# Altium integrated library MCU_CPU.IntLib: 57 symbols (part 1 of 2) (continued)
## 1892ВМ14Я (continued)
part O pins: AC12 GND, AC13 GND, AC16 GND, AC17 GND, AC20 GND, AC21 GND, AC24 GND, AC25 GND, AC29 GND, AC30 GND, AC31 GND, AD12 GND, AD13 GND, AD16 GND, AD17 GND, AD20 GND, AD21 GND, AD24 GND, AD25 GND, AD29 GND, AD30 GND, AD31 GND, AE10 GND, AE11 GND, AE14 GND, AE15 GND, AE18 GND, AE19 GND, AE22 GND, AE23 GND, AE26 GND, AE27 GND, AE28 GND, AE29 GND, AE30 GND, AE31 GND, AF10 GND, AF11 GND, AF14 GND, AF15 GND, AF18 GND, AF19 GND, AF22 GND, AF23 GND, AF26 GND, AF27 GND, AF28 GND, AF29 GND, AF30 GND, AF31 GND, AG14 GND, AG15 GND, AG16 GND, AG17 GND, AG26 GND, AG27 GND, AG28 GND, AG29 GND, AG30 GND, AG31 GND, AH16 GND, AH17 GND, AH26 GND, AH27 GND, AH28 GND, AH29 GND, AH30 GND, AH31 GND, AJ15 GND, AJ16 GND, AJ17 GND, AJ18 GND, AJ19 GND, AJ20 GND, AJ21 GND, AJ22 GND, AJ23 GND, AJ24 GND, AJ25 GND, AJ26 GND, AJ27 GND, AJ28 GND, AJ29 GND, AJ30 GND, AJ31 GND, AK17 GND, AK18 GND, AK19 GND, AK20 GND, AK21 GND
part P pins: AF6 RSVD10, AF7 RSVD8, AG6 RSVD15, AG7 RSVD14, AG10 RSVD0, AH6 RSVD17, AH7 RSVD16, AH8 RSVD7, AH9 RSVD4, AH10 RSVD3, AJ6 RSVD11, AJ7 RSVD12, AJ8 RSVD6, AJ9 RSVD2, AK6 RSVD13, AK7 RSVD9, AK8 RSVD5, AK9 RSVD1, AK22 GND, AK23 GND, AK24 GND, AK25 GND, AK26 GND, AK27 GND, AK28 GND, AK29 GND, AK30 GND, AK31 GND, AL17 GND, AL18 GND, AL19 GND, AL20 GND, AL21 GND, AL22 GND, AL23 GND, AL24 GND, AL25 GND, AL26 GND, AL27 GND, AL28 GND, AL29 GND, AL30 GND, AL31 GND, AP4 GND
part A text: CPU
part B text: CPU
part C text: CPU
part D text: CPU
part E text: CPU
part F text: CPU
part G text: CPU
part H text: CPU
part I text: CPU
part J text: CPU
part K text: CPU
part L text: CPU
part M text: CPU
part N text: CPU
part O text: CPU
part P text: CPU

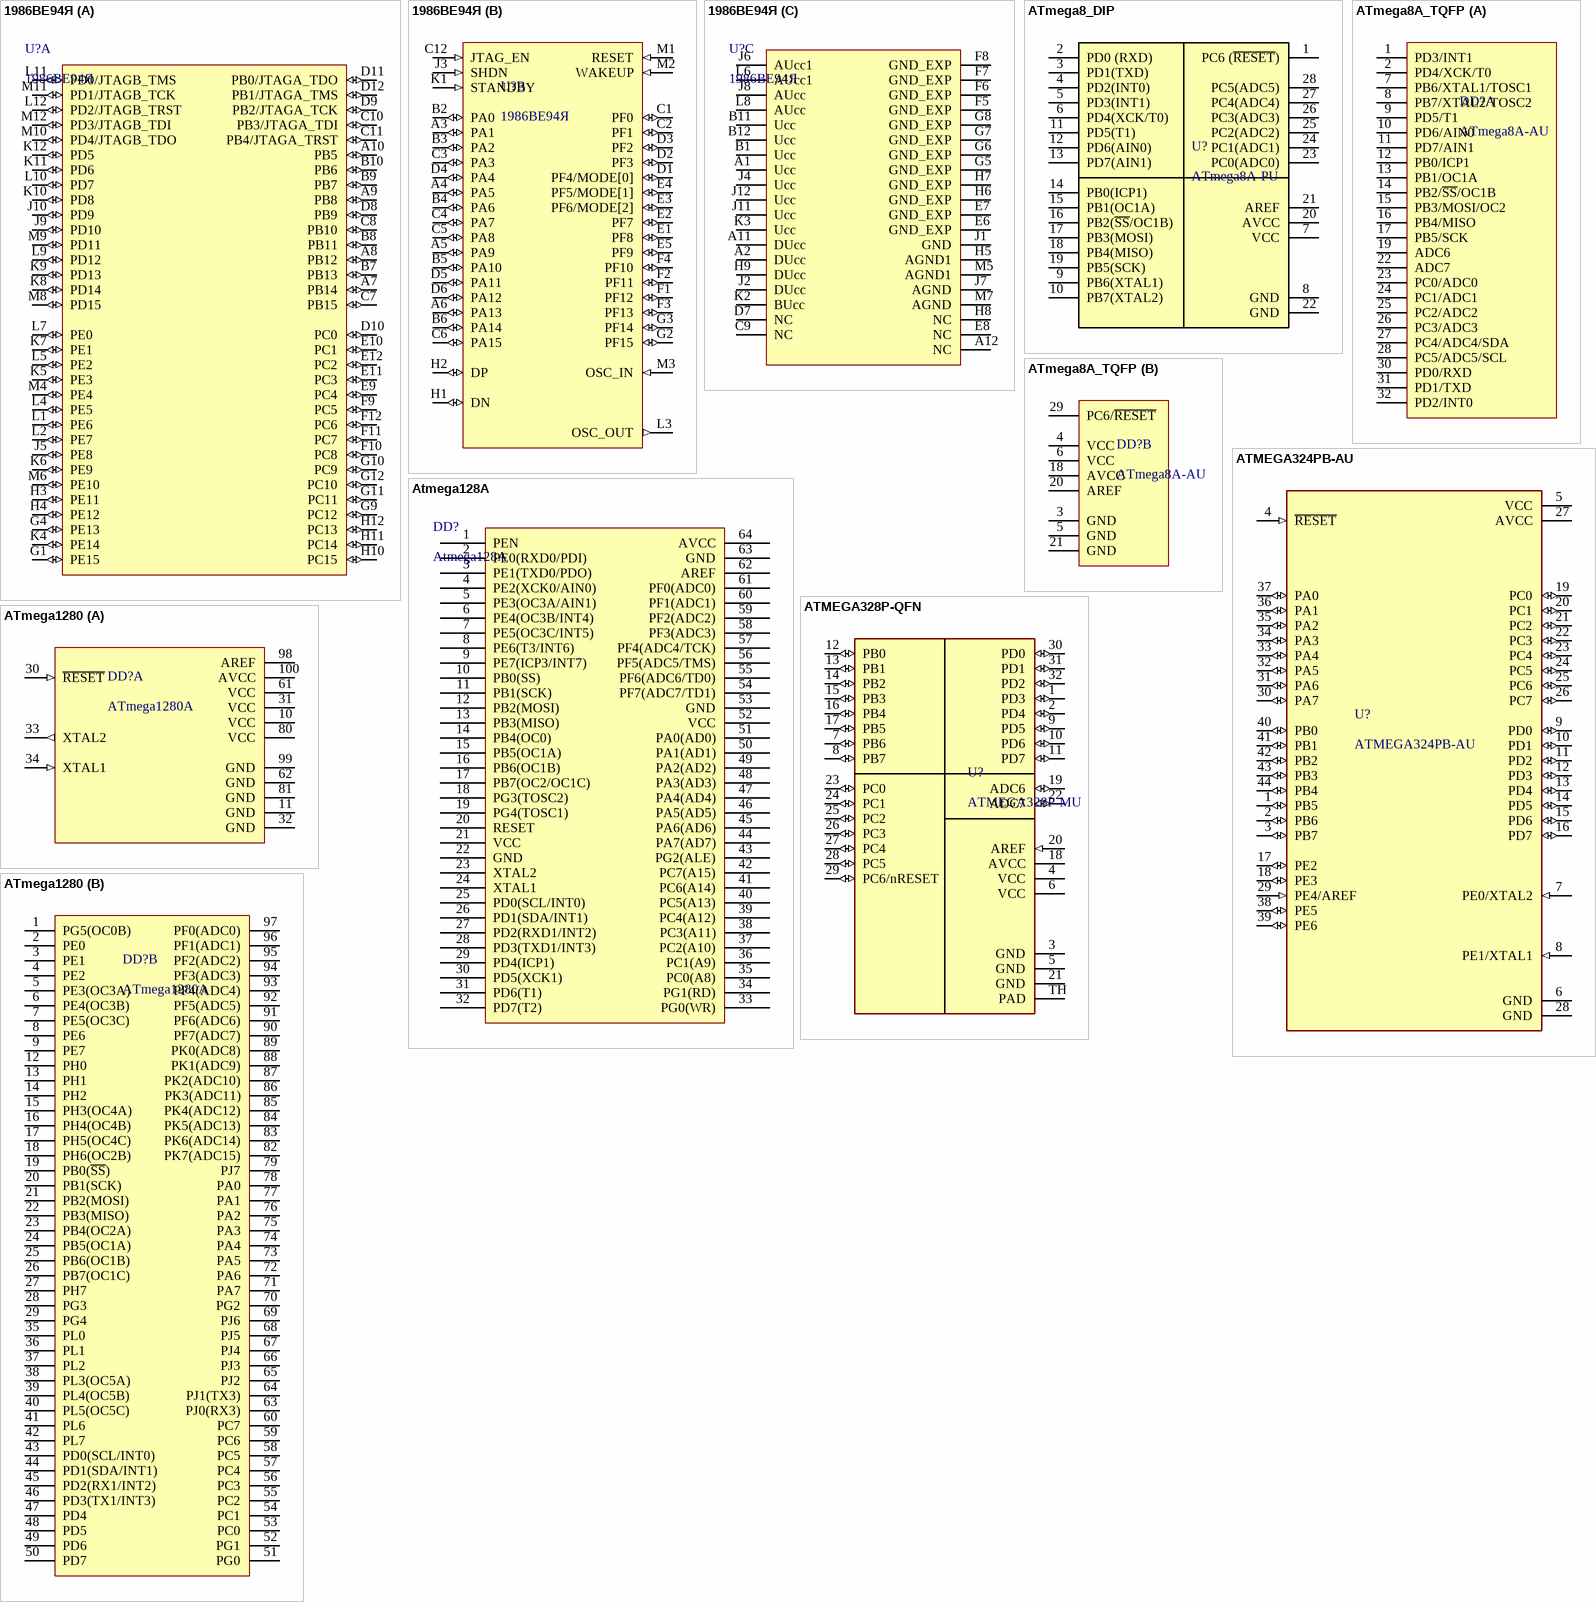
[diagram p4: symbols 1986ВЕ94Я to ATmega1280]

## 1986ВЕ94Я
designator U?
Cortex-M3
footprint МК 8307.144-АНЗ
part A pins: A7 PB14 (io), A8 PB12 (io), A9 PB8 (io), A10 PB5 (io), B7 PB13 (io), B8 PB11 (io), B9 PB7 (io), B10 PB6 (io), C7 PB15 (io), C8 PB10 (io), C10 PB3/JTAGA_TDI (io), C11 PB4/JTAGA_TRST (io), D8 PB9 (io), D9 PB2/JTAGA_TCK (io), D10 PC0 (io), D11 PB0/JTAGA_TDO (io), D12 PB1/JTAGA_TMS (io), E9 PC4 (io), E10 PC1 (io), E11 PC3 (io), E12 PC2 (io), F9 PC5 (io), F10 PC8 (io), F11 PC7 (io), F12 PC6 (io), G1 PE15 (io), G4 PE13 (io), G9 PC12 (io), G10 PC9 (io), G11 PC11 (io), G12 PC10 (io), H3 PE11 (io), H4 PE12 (io), H10 PC15 (io), H11 PC14 (io), H12 PC13 (io), J5 PE8 (io), J9 PD10 (io), J10 PD9 (io), K4 PE14 (io), K5 PE3 (io), K6 PE9 (io), K7 PE1 (io), K8 PD14 (io), K9 PD13 (io), K10 PD8 (io), K11 PD6 (io), K12 PD5 (io), L1 PE6 (io), L2 PE7 (io), L4 PE5 (io), L5 PE2 (io), L7 PE0 (io), L9 PD12 (io), L10 PD7 (io), L11 PD0/JTAGB_TMS (io), L12 PD2/JTAGB_TRST (io), M4 PE4 (io), M6 PE10 (io), M8 PD15 (io), M9 PD11 (io), M10 PD4/JTAGB_TDO (io), M11 PD1/JTAGB_TCK (io), M12 PD3/JTAGB_TDI (io)
part B pins: A3 PA1 (io), A4 PA5 (io), A5 PA9 (io), A6 PA13 (io), B2 PA0 (io), B3 PA2 (io), B4 PA6 (io), B5 PA10 (io), B6 PA14 (io), C1 PF0 (io), C2 PF1 (io), C3 PA3 (io), C4 PA7 (io), C5 PA8 (io), C6 PA15 (io), C12 JTAG_EN (in), D1 PF4/MODE[0] (io), D2 PF3 (io), D3 PF2 (io), D4 PA4 (io), D5 PA11 (io), D6 PA12 (io), E1 PF8 (io), E2 PF7 (io), E3 PF6/MODE[2] (io), E4 PF5/MODE[1] (io), E5 PF9 (io), F1 PF12 (io), F2 PF11 (io), F3 PF13 (io), F4 PF10 (io), G2 PF15 (io), G3 PF14 (io), H1 DN (io), H2 DP (io), J3 SHDN (in), K1 STANDBY (in), L3 OSC_OUT (out), M1 RESET (in), M2 WAKEUP (in), M3 OSC_IN (in)
part C pins: A1 Ucc (power), A2 DUcc (power), A11 DUcc (power), A12 NC, B1 Ucc (power), B11 Ucc (power), B12 Ucc (power), C9 NC, D7 NC, E6 GND_EXP (power), E7 GND_EXP (power), E8 NC, F5 GND_EXP (power), F6 GND_EXP (power), F7 GND_EXP (power), F8 GND_EXP (power), G5 GND_EXP (power), G6 GND_EXP (power), G7 GND_EXP (power), G8 GND_EXP (power), H5 AGND1 (power), H6 GND_EXP (power), H7 GND_EXP (power), H8 NC, H9 DUcc (power), J1 GND (power), J2 DUcc (power), J4 Ucc (power), J6 AUcc1 (power), J7 AGND (power), J8 AUcc (power), J11 Ucc (power), J12 Ucc (power), K2 BUcc (power), K3 Ucc (power), L6 AUcc1 (power), L8 AUcc (power), M5 AGND1 (power), M7 AGND (power)

## ATmega8_DIP
designator U?, comment ATmega8A-PU
MEGA; DefaultOrder: ATmega8A-PU; Order: *
footprint DIP-28 (Footprint not found)
pins: 1 PC6 (~{RESET}), 2 PD0 (RXD), 3 PD1(TXD), 4 PD2(INT0), 5 PD3(INT1), 6 PD4(XCK/T0), 7 VCC, 8 GND, 9 PB6(XTAL1), 10 PB7(XTAL2), 11 PD5(T1), 12 PD6(AIN0), 13 PD7(AIN1), 14 PB0(ICP1), 15 PB1(OC1A), 16 PB2(~{SS}/OC1B), 17 PB3(MOSI), 18 PB4(MISO), 19 PB5(SCK), 20 AVCC, 21 AREF, 22 GND, 23 PC0(ADC0), 24 PC1(ADC1), 25 PC2(ADC2), 26 PC3(ADC3), 27 PC4(ADC4), 28 PC5(ADC5)

## ATmega8A_TQFP
designator DD?, comment ATmega8A-AU
MEGA; DefaultOrder: ATmega8A-AU; Order: *
footprint TQFP-32 (Footprint not found)
part A pins: 1 PD3/INT1, 2 PD4/XCK/T0, 7 PB6/XTAL1/TOSC1, 8 PB7/XTAL2/TOSC2, 9 PD5/T1, 10 PD6/AIN0, 11 PD7/AIN1, 12 PB0/ICP1, 13 PB1/OC1A, 14 PB2/~{SS}/OC1B, 15 PB3/MOSI/OC2, 16 PB4/MISO, 17 PB5/SCK, 19 ADC6, 22 ADC7, 23 PC0/ADC0, 24 PC1/ADC1, 25 PC2/ADC2, 26 PC3/ADC3, 27 PC4/ADC4/SDA, 28 PC5/ADC5/SCL, 30 PD0/RXD, 31 PD1/TXD, 32 PD2/INT0
part B pins: 3 GND, 4 VCC, 5 GND, 6 VCC, 18 AVCC, 20 AREF, 21 GND, 29 PC6/~{RESET}

## Atmega128A
designator DD?
!proverka, AVR 8-bit MCU
pins: 1 PEN, 2 PE0(RXD0/PDI), 3 PE1(TXD0/PDO), 4 PE2(XCK0/AIN0), 5 PE3(OC3A/AIN1), 6 PE4(OC3B/INT4), 7 PE5(OC3C/INT5), 8 PE6(T3/INT6), 9 PE7(ICP3/INT7), 10 PB0(SS), 11 PB1(SCK), 12 PB2(MOSI), 13 PB3(MISO), 14 PB4(OC0), 15 PB5(OC1A), 16 PB6(OC1B), 17 PB7(OC2/OC1C), 18 PG3(TOSC2), 19 PG4(TOSC1), 20 RESET, 21 VCC, 22 GND, 23 XTAL2, 24 XTAL1, 25 PD0(SCL/INT0), 26 PD1(SDA/INT1), 27 PD2(RXD1/INT2), 28 PD3(TXD1/INT3), 29 PD4(ICP1), 30 PD5(XCK1), 31 PD6(T1), 32 PD7(T2), 33 PG0(WR), 34 PG1(RD), 35 PC0(A8), 36 PC1(A9), 37 PC2(A10), 38 PC3(A11), 39 PC4(A12), 40 PC5(A13), 41 PC6(A14), 42 PC7(A15), 43 PG2(ALE), 44 PA7(AD7), 45 PA6(AD6), 46 PA5(AD5), 47 PA4(AD4), 48 PA3(AD3), 49 PA2(AD2), 50 PA1(AD1), 51 PA0(AD0), 52 VCC, 53 GND, 54 PF7(ADC7/TD1), 55 PF6(ADC6/TD0), 56 PF5(ADC5/TMS), 57 PF4(ADC4/TCK), 58 PF3(ADC3), 59 PF2(ADC2), 60 PF1(ADC1), 61 PF0(ADC0), 62 AREF, 63 GND, 64 AVCC

## ATMEGA324PB-AU
designator U?
MEGA
footprint TQFP-44
pins: 1 PB5 (io), 2 PB6 (io), 3 PB7 (io), 4 ~{RESET} (in), 5 VCC (power), 6 GND (power), 7 PE0/XTAL2 (in), 8 PE1/XTAL1 (in), 9 PD0 (io), 10 PD1 (io), 11 PD2 (io), 12 PD3 (io), 13 PD4 (io), 14 PD5 (io), 15 PD6 (io), 16 PD7 (io), 17 PE2 (io), 18 PE3 (io), 19 PC0 (io), 20 PC1 (io), 21 PC2 (io), 22 PC3 (io), 23 PC4 (io), 24 PC5 (io), 25 PC6 (io), 26 PC7 (io), 27 AVCC (power), 28 GND (power), 29 PE4/AREF (in), 30 PA7 (io), 31 PA6 (io), 32 PA5 (io), 33 PA4 (io), 34 PA3 (io), 35 PA2 (io), 36 PA1 (io), 37 PA0 (io), 38 PE5 (io), 39 PE6 (io), 40 PB0 (io), 41 PB1 (io), 42 PB2 (io), 43 PB3 (io), 44 PB4 (io)

## ATMEGA328P-QFN
designator U?, comment ATMEGA328P-MU
MEGA; MF: Microchip; Value: *; Package: VQFN-32 Microchip; Price: None; MP: ATMEGA328P-MU; Availability: Good; SnapEDA_Link: https://www.snapeda.com/parts/ATMEGA328P-MU/Microchip/view-part/649548/?ref=snap; Check_prices: https://www.snapeda.com/parts/ATMEGA328P-MU/Microchip/view-part/649548/?ref=eda; Purchase-URL: https://pricing.snapeda.com/search/part/ATMEGA328P-MU/?ref=eda
footprint QFN-32
pins: 1 PD3 (io), 2 PD4 (io), 3 GND (power), 4 VCC (power), 5 GND (power), 6 VCC (power), 7 PB6 (io), 8 PB7 (io), 9 PD5 (io), 10 PD6 (io), 11 PD7 (io), 12 PB0 (io), 13 PB1 (io), 14 PB2 (io), 15 PB3 (io), 16 PB4 (io), 17 PB5 (io), 18 AVCC (power), 19 ADC6 (io), 20 AREF (in), 21 GND (power), 22 ADC7 (io), 23 PC0 (io), 24 PC1 (io), 25 PC2 (io), 26 PC3 (io), 27 PC4 (io), 28 PC5 (io), 29 PC6/nRESET (io), 30 PD0 (io), 31 PD1 (io), 32 PD2 (io), TH PAD (power)

## ATmega1280
designator DD?, comment ATmega1280A
MEGA; DefaultOrder: ATmega1280-16AU; Order: *
footprint TQFP-100 (Footprint not found)
part A pins: 10 VCC (power), 11 GND (power), 30 ~{RESET} (in), 31 VCC (power), 32 GND (power), 33 XTAL2 (out), 34 XTAL1 (in), 61 VCC (power), 62 GND (power), 80 VCC (power), 81 GND (power), 98 AREF (power), 99 GND (power), 100 AVCC (power)
part B pins: 1 PG5(OC0B), 2 PE0, 3 PE1, 4 PE2, 5 PE3(OC3A), 6 PE4(OC3B), 7 PE5(OC3C), 8 PE6, 9 PE7, 12 PH0, 13 PH1, 14 PH2, 15 PH3(OC4A), 16 PH4(OC4B), 17 PH5(OC4C), 18 PH6(OC2B), 19 PB0(~{SS}), 20 PB1(SCK), 21 PB2(MOSI), 22 PB3(MISO), 23 PB4(OC2A), 24 PB5(OC1A), 25 PB6(OC1B), 26 PB7(OC1C), 27 PH7, 28 PG3, 29 PG4, 35 PL0, 36 PL1, 37 PL2, 38 PL3(OC5A), 39 PL4(OC5B), 40 PL5(OC5C), 41 PL6, 42 PL7, 43 PD0(SCL/INT0), 44 PD1(SDA/INT1), 45 PD2(RX1/INT2), 46 PD3(TX1/INT3), 47 PD4, 48 PD5, 49 PD6, 50 PD7, 51 PG0, 52 PG1, 53 PC0, 54 PC1, 55 PC2, 56 PC3, 57 PC4, 58 PC5, 59 PC6, 60 PC7, 63 PJ0(RX3), 64 PJ1(TX3), 65 PJ2, 66 PJ3, 67 PJ4, 68 PJ5, 69 PJ6, 70 PG2, 71 PA7, 72 PA6, 73 PA5, 74 PA4, 75 PA3, 76 PA2, 77 PA1, 78 PA0, 79 PJ7, 82 PK7(ADC15), 83 PK6(ADC14), 84 PK5(ADC13), 85 PK4(ADC12), 86 PK3(ADC11), 87 PK2(ADC10), 88 PK1(ADC9), 89 PK0(ADC8), 90 PF7(ADC7), 91 PF6(ADC6), 92 PF5(ADC5), 93 PF4(ADC4), 94 PF3(ADC3), 95 PF2(ADC2), 96 PF1(ADC1), 97 PF0(ADC0)

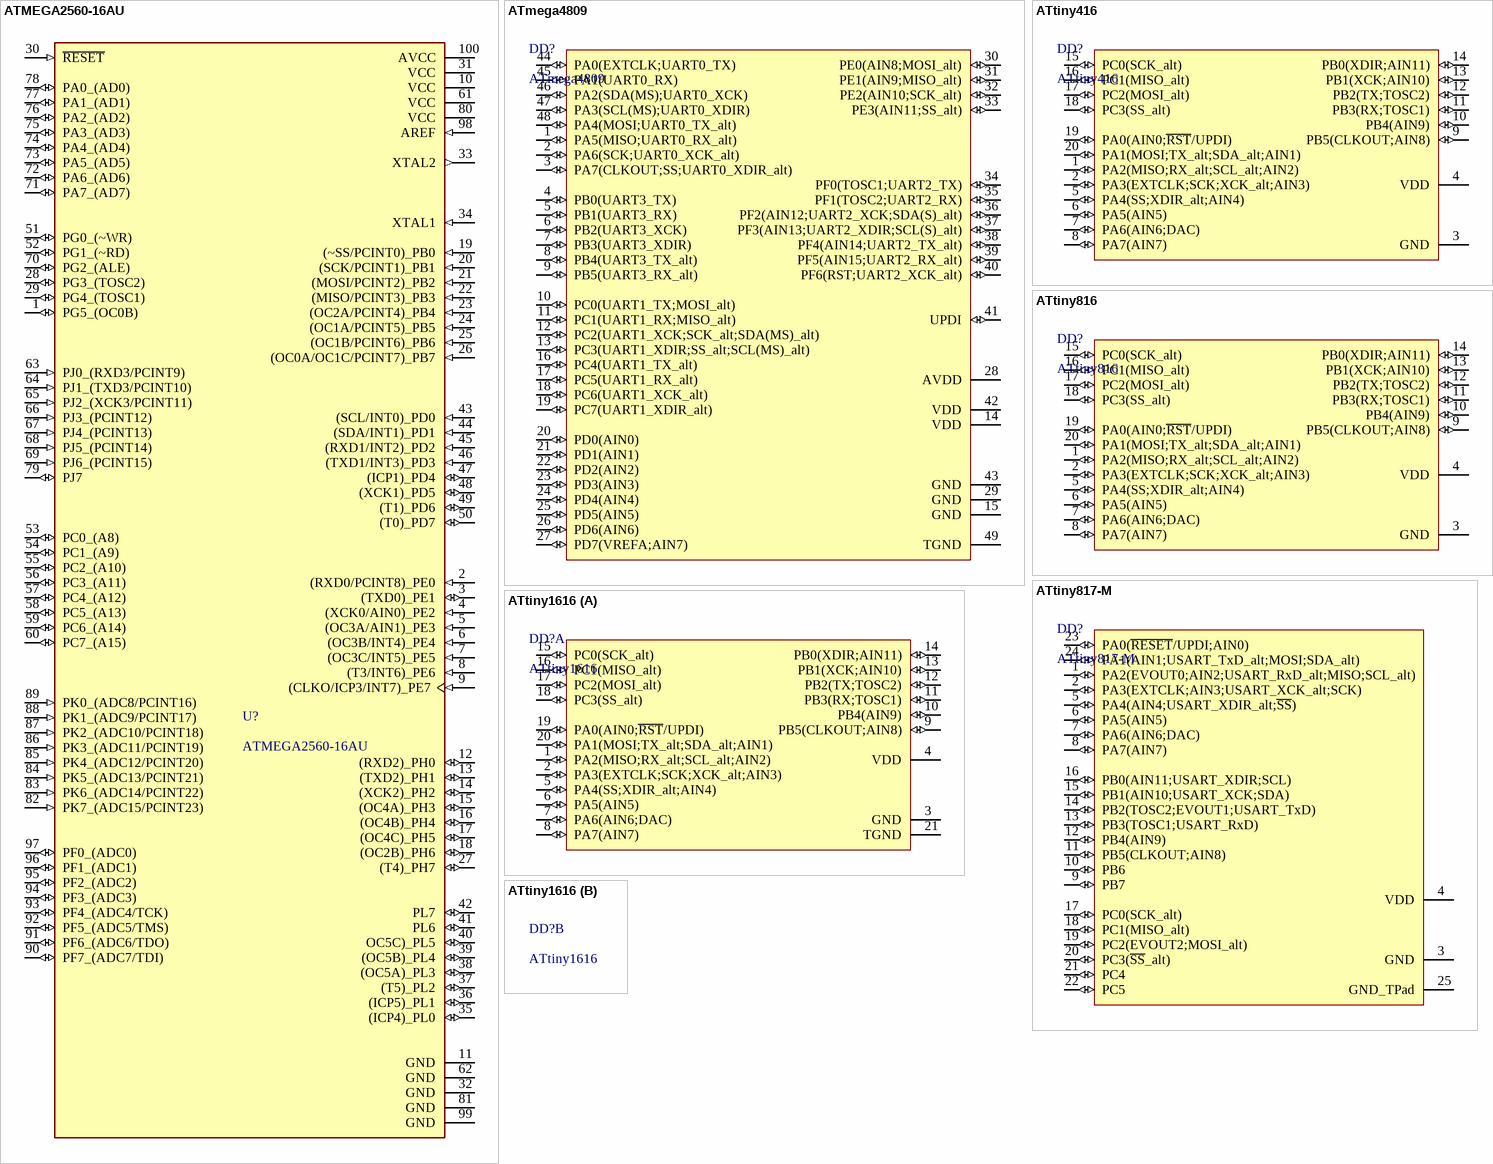
[diagram p5: symbols ATMEGA2560-16AU to ATtiny1616]

## ATMEGA2560-16AU
designator U?
MEGA; IsSMT: NoSMT; Order: ATMega2560-16AU; LCSC Part #: *; BuyLink1: *
footprint LQFP-100 (SQFP, 100-Leads, Body 16,7x16,7mm (max), Pitch 0,50mm, IPC Medium Density)
pins: 1 PG5_(OC0B) (io), 2 (RXD0/PCINT8)_PE0 (in), 3 (TXD0)_PE1 (io), 4 (XCK0/AIN0)_PE2 (in), 5 (OC3A/AIN1)_PE3 (in), 6 (OC3B/INT4)_PE4 (in), 7 (OC3C/INT5)_PE5 (in), 8 (T3/INT6)_PE6 (in), 9 (CLKO/ICP3/INT7)_PE7 (in), 10 VCC (power), 11 GND (power), 12 (RXD2)_PH0 (io), 13 (TXD2)_PH1 (io), 14 (XCK2)_PH2 (io), 15 (OC4A)_PH3 (io), 16 (OC4B)_PH4 (io), 17 (OC4C)_PH5 (io), 18 (OC2B)_PH6 (io), 19 (~SS/PCINT0)_PB0 (in), 20 (SCK/PCINT1)_PB1 (in), 21 (MOSI/PCINT2)_PB2 (in), 22 (MISO/PCINT3)_PB3 (in), 23 (OC2A/PCINT4)_PB4 (in), 24 (OC1A/PCINT5)_PB5 (in), 25 (OC1B/PCINT6)_PB6 (in), 26 (OC0A/OC1C/PCINT7)_PB7 (in), 27 (T4)_PH7 (io), 28 PG3_(TOSC2) (io), 29 PG4_(TOSC1) (io), 30 ~{RESET} (in), 31 VCC (power), 32 GND (power), 33 XTAL2 (out), 34 XTAL1 (in), 35 (ICP4)_PL0 (io), 36 (ICP5)_PL1 (io), 37 (T5)_PL2 (io), 38 (OC5A)_PL3 (io), 39 (OC5B)_PL4 (io), 40 OC5C)_PL5 (io), 41 PL6 (io), 42 PL7 (io), 43 (SCL/INT0)_PD0 (in), 44 (SDA/INT1)_PD1 (in), 45 (RXD1/INT2)_PD2 (in), 46 (TXD1/INT3)_PD3 (in), 47 (ICP1)_PD4 (io), 48 (XCK1)_PD5 (io), 49 (T1)_PD6 (io), 50 (T0)_PD7 (io), 51 PG0_(~WR) (io), 52 PG1_(~RD) (io), 53 PC0_(A8) (io), 54 PC1_(A9) (io), 55 PC2_(A10) (io), 56 PC3_(A11) (io), 57 PC4_(A12) (io), 58 PC5_(A13) (io), 59 PC6_(A14) (io), 60 PC7_(A15) (io), 61 VCC (power), 62 GND (power), 63 PJ0_(RXD3/PCINT9) (in), 64 PJ1_(TXD3/PCINT10) (in), 65 PJ2_(XCK3/PCINT11) (in), 66 PJ3_(PCINT12) (in), 67 PJ4_(PCINT13) (in), 68 PJ5_(PCINT14) (in), 69 PJ6_(PCINT15) (in), 70 PG2_(ALE) (io), 71 PA7_(AD7) (io), 72 PA6_(AD6) (io), 73 PA5_(AD5) (io), 74 PA4_(AD4) (io), 75 PA3_(AD3) (io), 76 PA2_(AD2) (io), 77 PA1_(AD1) (io), 78 PA0_(AD0) (io), 79 PJ7 (io), 80 VCC (power), 81 GND (power), 82 PK7_(ADC15/PCINT23) (in), 83 PK6_(ADC14/PCINT22) (in), 84 PK5_(ADC13/PCINT21) (in), 85 PK4_(ADC12/PCINT20) (in), 86 PK3_(ADC11/PCINT19) (in), 87 PK2_(ADC10/PCINT18) (in), 88 PK1_(ADC9/PCINT17) (in), 89 PK0_(ADC8/PCINT16) (in), 90 PF7_(ADC7/TDI) (io), 91 PF6_(ADC6/TDO) (io), 92 PF5_(ADC5/TMS) (io), 93 PF4_(ADC4/TCK) (io), 94 PF3_(ADC3) (io), 95 PF2_(ADC2) (io), 96 PF1_(ADC1) (io), 97 PF0_(ADC0) (io), 98 AREF (in), 99 GND (power), 100 AVCC (power)

## ATmega4809
designator DD?
MEGA
footprint QFN-48M (QFN, 48-Leads, Body 6,00x6,00mm, Pitch 0,40mm, Thermal Pad 4,60x4,60mm, IPC Low Density)
pins: 1 PA5(MISO;UART0_RX_alt) (io), 2 PA6(SCK;UART0_XCK_alt) (io), 3 PA7(CLKOUT;SS;UART0_XDIR_alt) (io), 4 PB0(UART3_TX) (io), 5 PB1(UART3_RX) (io), 6 PB2(UART3_XCK) (io), 7 PB3(UART3_XDIR) (io), 8 PB4(UART3_TX_alt) (io), 9 PB5(UART3_RX_alt) (io), 10 PC0(UART1_TX;MOSI_alt) (io), 11 PC1(UART1_RX;MISO_alt) (io), 12 PC2(UART1_XCK;SCK_alt;SDA(MS)_alt) (io), 13 PC3(UART1_XDIR;SS_alt;SCL(MS)_alt) (io), 14 VDD (power), 15 GND (power), 16 PC4(UART1_TX_alt) (io), 17 PC5(UART1_RX_alt) (io), 18 PC6(UART1_XCK_alt) (io), 19 PC7(UART1_XDIR_alt) (io), 20 PD0(AIN0) (io), 21 PD1(AIN1) (io), 22 PD2(AIN2) (io), 23 PD3(AIN3) (io), 24 PD4(AIN4) (io), 25 PD5(AIN5) (io), 26 PD6(AIN6) (io), 27 PD7(VREFA;AIN7) (io), 28 AVDD (power), 29 GND (power), 30 PE0(AIN8;MOSI_alt) (io), 31 PE1(AIN9;MISO_alt) (io), 32 PE2(AIN10;SCK_alt) (io), 33 PE3(AIN11;SS_alt) (io), 34 PF0(TOSC1;UART2_TX) (io), 35 PF1(TOSC2;UART2_RX) (io), 36 PF2(AIN12;UART2_XCK;SDA(S)_alt) (io), 37 PF3(AIN13;UART2_XDIR;SCL(S)_alt) (io), 38 PF4(AIN14;UART2_TX_alt) (io), 39 PF5(AIN15;UART2_RX_alt) (io), 40 PF6(RST;UART2_XCK_alt) (io), 41 UPDI (io), 42 VDD (power), 43 GND (power), 44 PA0(EXTCLK;UART0_TX) (io), 45 PA1(UART0_RX) (io), 46 PA2(SDA(MS);UART0_XCK) (io), 47 PA3(SCL(MS);UART0_XDIR) (io), 48 PA4(MOSI;UART0_TX_alt) (io), 49 TGND (power)

## ATtiny416
designator DD?
TINY; Order: ATtiny416*
pins: 1 PA2(MISO;RX_alt;SCL_alt;AIN2) (io), 2 PA3(EXTCLK;SCK;XCK_alt;AIN3) (io), 3 GND (power), 4 VDD (power), 5 PA4(SS;XDIR_alt;AIN4) (io), 6 PA5(AIN5) (io), 7 PA6(AIN6;DAC) (io), 8 PA7(AIN7) (io), 9 PB5(CLKOUT;AIN8) (io), 10 PB4(AIN9) (io), 11 PB3(RX;TOSC1) (io), 12 PB2(TX;TOSC2) (io), 13 PB1(XCK;AIN10) (io), 14 PB0(XDIR;AIN11) (io), 15 PC0(SCK_alt) (io), 16 PC1(MISO_alt) (io), 17 PC2(MOSI_alt) (io), 18 PC3(SS_alt) (io), 19 PA0(AIN0;~{RST}/UPDI) (io), 20 PA1(MOSI;TX_alt;SDA_alt;AIN1) (io)

## ATtiny816
designator DD?
TINY; Order: ATtiny816*
pins: 1 PA2(MISO;RX_alt;SCL_alt;AIN2) (io), 2 PA3(EXTCLK;SCK;XCK_alt;AIN3) (io), 3 GND (power), 4 VDD (power), 5 PA4(SS;XDIR_alt;AIN4) (io), 6 PA5(AIN5) (io), 7 PA6(AIN6;DAC) (io), 8 PA7(AIN7) (io), 9 PB5(CLKOUT;AIN8) (io), 10 PB4(AIN9) (io), 11 PB3(RX;TOSC1) (io), 12 PB2(TX;TOSC2) (io), 13 PB1(XCK;AIN10) (io), 14 PB0(XDIR;AIN11) (io), 15 PC0(SCK_alt) (io), 16 PC1(MISO_alt) (io), 17 PC2(MOSI_alt) (io), 18 PC3(SS_alt) (io), 19 PA0(AIN0;~{RST}/UPDI) (io), 20 PA1(MOSI;TX_alt;SDA_alt;AIN1) (io)

## ATtiny817-M
designator DD?
TINY; Order: *
pins: 1 PA2(EVOUT0;AIN2;USART_RxD_alt;MISO;SCL_alt) (io), 2 PA3(EXTCLK;AIN3;USART_XCK_alt;SCK) (io), 3 GND (power), 4 VDD (power), 5 PA4(AIN4;USART_XDIR_alt;~{SS}) (io), 6 PA5(AIN5) (io), 7 PA6(AIN6;DAC) (io), 8 PA7(AIN7) (io), 9 PB7 (io), 10 PB6 (io), 11 PB5(CLKOUT;AIN8) (io), 12 PB4(AIN9) (io), 13 PB3(TOSC1;USART_RxD) (io), 14 PB2(TOSC2;EVOUT1;USART_TxD) (io), 15 PB1(AIN10;USART_XCK;SDA) (io), 16 PB0(AIN11;USART_XDIR;SCL) (io), 17 PC0(SCK_alt) (io), 18 PC1(MISO_alt) (io), 19 PC2(EVOUT2;MOSI_alt) (io), 20 PC3(~{SS}_alt) (io), 21 PC4 (io), 22 PC5 (io), 23 PA0(~{RESET}/UPDI;AIN0) (io), 24 PA1(AIN1;USART_TxD_alt;MOSI;SDA_alt) (io), 25 GND_TPad (power)

## ATtiny1616
designator DD?
TINY; Order: ATtiny1616*
footprint QFN-20M (QFN, 20-Leads, Body 3,00x3,00mm, Pitch 0,40mm, Thermal Pad 1,70x1,70mm, IPC Low Density)
part A pins: 1 PA2(MISO;RX_alt;SCL_alt;AIN2) (io), 2 PA3(EXTCLK;SCK;XCK_alt;AIN3) (io), 3 GND (power), 4 VDD (power), 5 PA4(SS;XDIR_alt;AIN4) (io), 6 PA5(AIN5) (io), 7 PA6(AIN6;DAC) (io), 8 PA7(AIN7) (io), 9 PB5(CLKOUT;AIN8) (io), 10 PB4(AIN9) (io), 11 PB3(RX;TOSC1) (io), 12 PB2(TX;TOSC2) (io), 13 PB1(XCK;AIN10) (io), 14 PB0(XDIR;AIN11) (io), 15 PC0(SCK_alt) (io), 16 PC1(MISO_alt) (io), 17 PC2(MOSI_alt) (io), 18 PC3(SS_alt) (io), 19 PA0(AIN0;~{RST}/UPDI) (io), 20 PA1(MOSI;TX_alt;SDA_alt;AIN1) (io), 21 TGND (power)

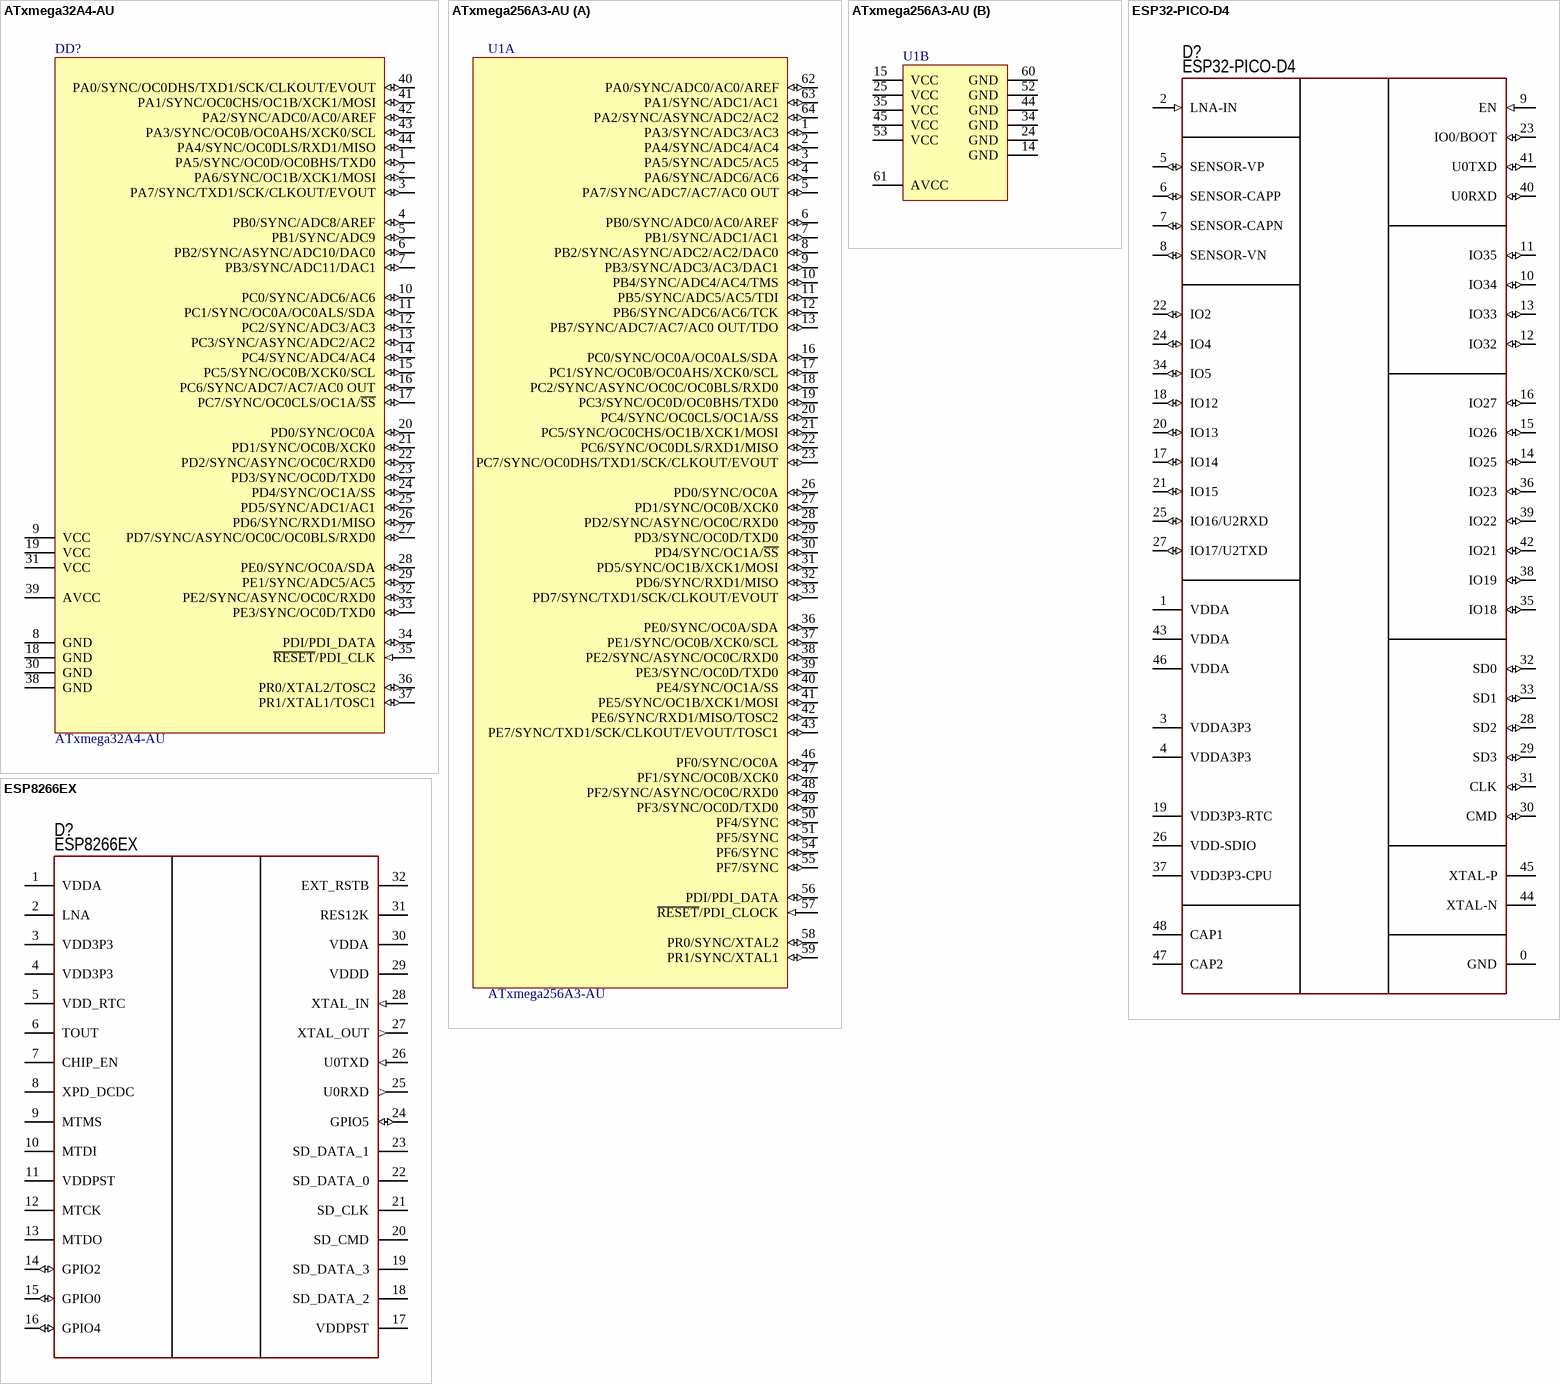
[diagram p6: symbols ATxmega32A4-AU to ESP8266EX]

## ATxmega32A4-AU
designator DD?
XMEGA; Published: 1-Apr-2010; DatasheetVersion: revN, Feb-2010; PackageVersion: rev.B, Oct-2001; PackageReference: 44A; Publisher: Altium Limited; PackageDescription: 44-Pin Plastic Thin Profile Quad Flat Pack, 10 x 10 x 1.0 mm Body, 0.8 mm Pitch (TQFP); Supplier 1: Digi-Key; Supplier Part Number 1: ATXMEGA32A4-AU-ND; Supplier 2: Farnell; Supplier Part Number 2: 1748557; Supplier 3: Mouser; Supplier Part Number 3: 556-ATXMEGA32A4-AU; ComponentLink1Description: Manufacturer Link; ComponentLink1URL: http://www.atmel.com/products/avr/default.asp?; ComponentLink2Description: ATxmega16A4/32A4/64A4/128A4 Datasheet; ComponentLink2URL: http://www.atmel.com/dyn/resources/prod_documents/doc8069.pdf; ComponentLink3Description: Atmel.com Home; ComponentLink3URL: http://www.atmel.com
footprint 44A_N (Thin QFP, 44-Leads, Body 10x10mm, Pitch 0.8mm, IPC Medium Density)
footprint 44A_L (Thin QFP, 44-Leads, Body 10x10mm, Pitch 0.8mm, IPC High Density)
footprint 44A_M (Thin QFP, 44-Leads, Body 10x10mm, Pitch 0.8mm, IPC Low Density)
pins: 1 PA5/SYNC/OC0D/OC0BHS/TXD0 (io), 2 PA6/SYNC/OC1B/XCK1/MOSI (io), 3 PA7/SYNC/TXD1/SCK/CLKOUT/EVOUT (io), 4 PB0/SYNC/ADC8/AREF (io), 5 PB1/SYNC/ADC9 (io), 6 PB2/SYNC/ASYNC/ADC10/DAC0 (io), 7 PB3/SYNC/ADC11/DAC1 (io), 8 GND (power), 9 VCC (power), 10 PC0/SYNC/ADC6/AC6 (io), 11 PC1/SYNC/OC0A/OC0ALS/SDA (io), 12 PC2/SYNC/ADC3/AC3 (io), 13 PC3/SYNC/ASYNC/ADC2/AC2 (io), 14 PC4/SYNC/ADC4/AC4 (io), 15 PC5/SYNC/OC0B/XCK0/SCL (io), 16 PC6/SYNC/ADC7/AC7/AC0 OUT (io), 17 PC7/SYNC/OC0CLS/OC1A/~{SS} (io), 18 GND (power), 19 VCC (power), 20 PD0/SYNC/OC0A (io), 21 PD1/SYNC/OC0B/XCK0 (io), 22 PD2/SYNC/ASYNC/OC0C/RXD0 (io), 23 PD3/SYNC/OC0D/TXD0 (io), 24 PD4/SYNC/OC1A/SS (io), 25 PD5/SYNC/ADC1/AC1 (io), 26 PD6/SYNC/RXD1/MISO (io), 27 PD7/SYNC/ASYNC/OC0C/OC0BLS/RXD0 (io), 28 PE0/SYNC/OC0A/SDA (io), 29 PE1/SYNC/ADC5/AC5 (io), 30 GND (power), 31 VCC (power), 32 PE2/SYNC/ASYNC/OC0C/RXD0 (io), 33 PE3/SYNC/OC0D/TXD0 (io), 34 PDI/PDI_DATA (io), 35 ~{RESET}/PDI_CLK (in), 36 PR0/XTAL2/TOSC2 (io), 37 PR1/XTAL1/TOSC1 (io), 38 GND (power), 39 AVCC (power), 40 PA0/SYNC/OC0DHS/TXD1/SCK/CLKOUT/EVOUT (io), 41 PA1/SYNC/OC0CHS/OC1B/XCK1/MOSI (io), 42 PA2/SYNC/ADC0/AC0/AREF (io), 43 PA3/SYNC/OC0B/OC0AHS/XCK0/SCL (io), 44 PA4/SYNC/OC0DLS/RXD1/MISO (io)

## ATxmega256A3-AU
designator U1
XMEGA; Published: 1-Apr-2010; DatasheetVersion: revQ, Feb-2010; PackageVersion: revB, Oct-2001; PackageReference: 64A; Publisher: Altium Limited; PackageDescription: 64-Pin Plastic Thin Profile Quad Flat Pack, 14 x 14 x 1.0 mm Body, 0.8 mm Pitch (TQFP); Supplier 1: Digi-Key; Supplier Part Number 1: ATXMEGA256A3-AU-ND; Supplier 2: Farnell; Supplier Part Number 2: 1748554; Supplier 3: Mouser; Supplier Part Number 3: 556-ATXMEGA256A3-AU; Code_JEDEC: MS-026-AEB; ComponentLink1Description: Manufacturer Link; ComponentLink1URL: http://www.atmel.com/products/avr/default.asp?; ComponentLink2Description: ATxmega64A3/128A3/192A3/256A3 Datasheet; ComponentLink2URL: http://www.atmel.com/dyn/resources/prod_documents/doc8068.pdf; ComponentLink3Description: Atmel.com Home; ComponentLink3URL: http://www.atmel.com
footprint 64A_N (Thin QFP, 64-Leads, Body 14x14mm, Pitch 0.8mm, IPC Medium Density)
footprint 64A_L (Thin QFP, 64-Leads, Body 14x14mm, Pitch 0.8mm, IPC High Density)
footprint 64A_M (Thin QFP, 64-Leads, Body 14x14mm, Pitch 0.8mm, IPC Low Density)
part A pins: 1 PA3/SYNC/ADC3/AC3 (io), 2 PA4/SYNC/ADC4/AC4 (io), 3 PA5/SYNC/ADC5/AC5 (io), 4 PA6/SYNC/ADC6/AC6 (io), 5 PA7/SYNC/ADC7/AC7/AC0 OUT (io), 6 PB0/SYNC/ADC0/AC0/AREF (io), 7 PB1/SYNC/ADC1/AC1 (io), 8 PB2/SYNC/ASYNC/ADC2/AC2/DAC0 (io), 9 PB3/SYNC/ADC3/AC3/DAC1 (io), 10 PB4/SYNC/ADC4/AC4/TMS (io), 11 PB5/SYNC/ADC5/AC5/TDI (io), 12 PB6/SYNC/ADC6/AC6/TCK (io), 13 PB7/SYNC/ADC7/AC7/AC0 OUT/TDO (io), 16 PC0/SYNC/OC0A/OC0ALS/SDA (io), 17 PC1/SYNC/OC0B/OC0AHS/XCK0/SCL (io), 18 PC2/SYNC/ASYNC/OC0C/OC0BLS/RXD0 (io), 19 PC3/SYNC/OC0D/OC0BHS/TXD0 (io), 20 PC4/SYNC/OC0CLS/OC1A/SS (io), 21 PC5/SYNC/OC0CHS/OC1B/XCK1/MOSI (io), 22 PC6/SYNC/OC0DLS/RXD1/MISO (io), 23 PC7/SYNC/OC0DHS/TXD1/SCK/CLKOUT/EVOUT (io), 26 PD0/SYNC/OC0A (io), 27 PD1/SYNC/OC0B/XCK0 (io), 28 PD2/SYNC/ASYNC/OC0C/RXD0 (io), 29 PD3/SYNC/OC0D/TXD0 (io), 30 PD4/SYNC/OC1A/~{SS} (io), 31 PD5/SYNC/OC1B/XCK1/MOSI (io), 32 PD6/SYNC/RXD1/MISO (io), 33 PD7/SYNC/TXD1/SCK/CLKOUT/EVOUT (io), 36 PE0/SYNC/OC0A/SDA (io), 37 PE1/SYNC/OC0B/XCK0/SCL (io), 38 PE2/SYNC/ASYNC/OC0C/RXD0 (io), 39 PE3/SYNC/OC0D/TXD0 (io), 40 PE4/SYNC/OC1A/SS (io), 41 PE5/SYNC/OC1B/XCK1/MOSI (io), 42 PE6/SYNC/RXD1/MISO/TOSC2 (io), 43 PE7/SYNC/TXD1/SCK/CLKOUT/EVOUT/TOSC1 (io), 46 PF0/SYNC/OC0A (io), 47 PF1/SYNC/OC0B/XCK0 (io), 48 PF2/SYNC/ASYNC/OC0C/RXD0 (io), 49 PF3/SYNC/OC0D/TXD0 (io), 50 PF4/SYNC (io), 51 PF5/SYNC (io), 54 PF6/SYNC (io), 55 PF7/SYNC (io), 56 PDI/PDI_DATA (io), 57 ~{RESET}/PDI_CLOCK (in), 58 PR0/SYNC/XTAL2 (io), 59 PR1/SYNC/XTAL1 (io), 62 PA0/SYNC/ADC0/AC0/AREF (io), 63 PA1/SYNC/ADC1/AC1 (io), 64 PA2/SYNC/ASYNC/ADC2/AC2 (io)
part B pins: 14 GND (power), 15 VCC (power), 24 GND (power), 25 VCC (power), 34 GND (power), 35 VCC (power), 44 GND (power), 45 VCC (power), 52 GND (power), 53 VCC (power), 60 GND (power), 61 AVCC (power)
